# Altium footprint library sun_library.PcbLib: 412 footprints (part 2 of 26)
Each footprint in its own frame and in the unit in brackets; x right, y up, seen from the top. Pads: shape width x height; smd on the part's side, far side on the other; paste and mask are expansions set on the pad; w line width, h text height; cw(c..) or ccw(c..) is an arc to the next point about the centre after c.
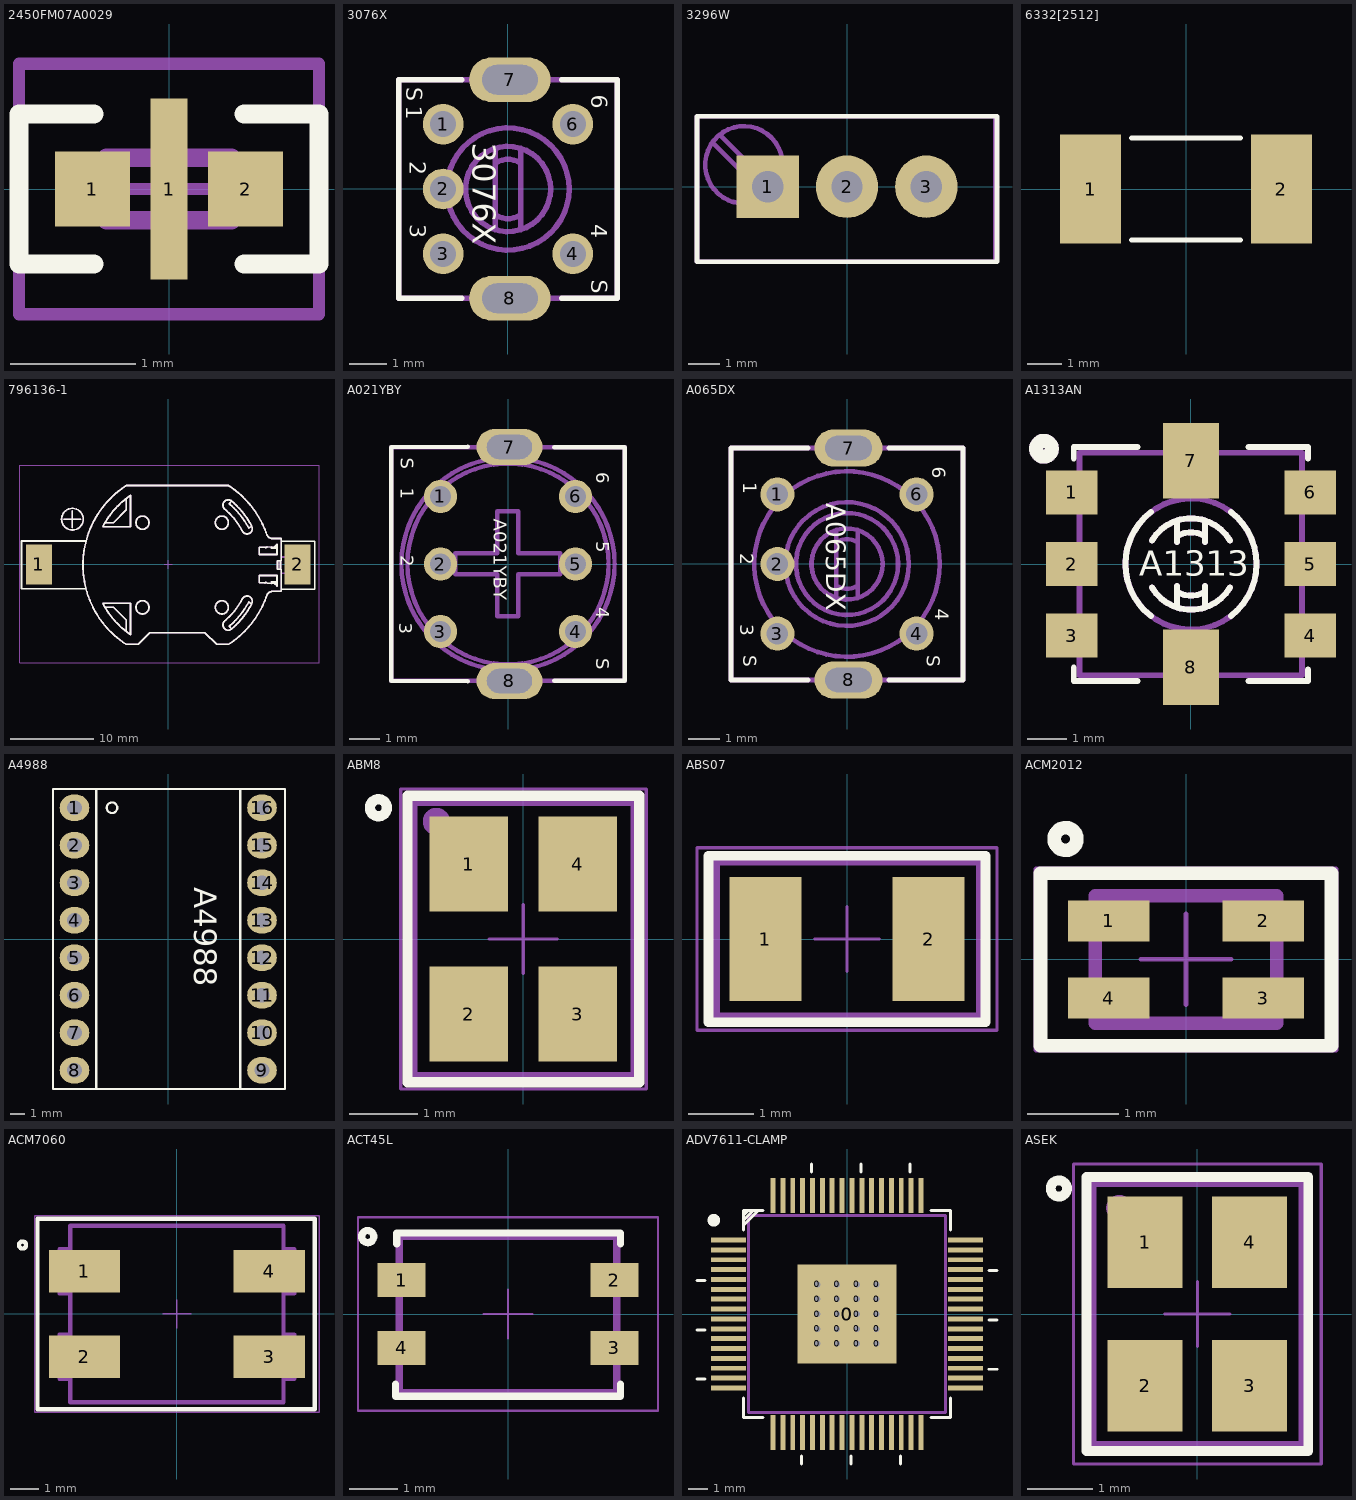
[diagram p1: the footprints below, top view; thin cyan lines are the x and y axes]

## 2450FM07A0029 [mm] "2.45GHz Impedance Matched balun"
height 1.4
pads (3):
  rect 0.6x0.6 smd: 1(-0.613,0) 2(0.613,0)
  rect 0.3x1.45 smd: 1(0,0)
Top Overlay:
  lines w0.15: -0.6,-0.6 -1.2,-0.6 -1.2,0.6 -0.6,0.6 ; 0.6,-0.6 1.2,-0.6 1.2,0.6 0.6,0.6
TopAssy 13:
  lines w0.15: -0.5,-0.25 -0.5,0.25 0.5,0.25 0.5,-0.25 -0.5,-0.25
CourtTop 15:
  lines w0.1: -0.5,0 0.5,0 ; 0,-0.5 0,0.5 ; -1.2,-1 -1.2,1 1.2,1 1.2,-1 -1.2,-1
3D body "User Library-RES0402.step": height 0.35, standoff 0, extent -0.5,-0.25 0.5,0.25

## 3076X [mm]
pads (7):
  round 1.1 hole 0.7: 1(-1.75,1.75) 2(-1.75,0) 3(-1.75,-1.75) 4(1.75,-1.75) 6(1.75,1.75)
  oval 2.2x1.2 hole 0.8 slot 1.5 at 0 deg: 7(0.05,2.95) 8(0.05,-2.95)
Top Overlay:
  lines w0.15: -1.25,-2.95 -2.95,-2.95 -2.95,2.95 -1.25,2.95 ; 1.45,-2.95 2.95,-2.95 2.95,2.95 1.45,2.95
  text "1" at -2.75,2.25 h0.44
  text "2" at -2.65,0.75 h0.44
  text "3" at -2.65,-0.95 h0.44
  text "4" at 2.25,-0.95 h0.44
  text "S" at 2.25,-2.45 h0.44
  text "S" at -2.75,2.75 h0.44
  text "3076X" at -0.95,1.25 h0.63
  text "6" at 2.25,2.55 h0.44
TopAssy 13:
  circle w0.15: c0,0 r1.15
  circle w0.15: c0,0 r1.65
  lines w0.15: -0.35,-1.1 -0.35,1.1 ; -0.35,0.7 cw(c0,0.137) 0.35,0.7 ; -0.349,-0.701 ccw(c0,-0.138) 0.349,-0.701 ; 0.35,-1.1 0.35,1.1 ; -2.95,-2.95 2.95,-2.95 2.95,2.95 -2.95,2.95 -2.95,-2.95

## 3296W [mm] "резистор многооборотный"
height 11.4
pads (3):
  rect 2x2 hole 1: 1(-2.54,0)
  round 2 hole 1: 2(0,0) 3(2.54,0)
Top Overlay:
  lines w0.15: -4.8,-2.4 -4.8,2.25 4.8,2.25 4.8,-2.4 -4.8,-2.4
  text "." at -4.2,2.6 h1.52
TopAssy 13:
  circle w0.15: c-3.3,0.7 r1.237
  lines w0.15: -4.3,1.4 -2.6,-0.3 ; -4.05,1.65 -2.35,-0.05 ; -4.8,-2.4 -4.8,2.25 4.75,2.25 4.75,-2.4 -4.8,-2.4
3D body "User Library-3296W.step": height 11.6, standoff -1.55, extent -4.765,-2.4 4.765,2.4

## 6332[2512] [mm] "Chip Resistor; Body 6.3 x 3.2 mm (LxW typ)"
height 0.6
pads (2):
  rect 1.8x3.2 smd: 1(-2.8,0) 2(2.8,0)
Top Overlay:
  lines w0.15: -1.6,-1.5 1.6,-1.5 ; -1.6,1.5 1.6,1.5

## 796136-1 [mm] "796136-1 BAT_HOLDER"
height 6.3
pads (2):
  rect 3.15x4.78 smd: 1(-15.52,0) 2(15.52,0)
Top Overlay:
  drawing of 1192 lines, arcs and shapes, not listed
TopAssy 13:
  drawing of 1191 lines, arcs and shapes, not listed
CourtTop 15:
  lines w0.05: -0.5,0 0.5,0 ; 0,-0.5 0,0.5 ; -17.8,-11.8 18.1,-11.8 18.1,11.9 -17.8,11.9 -17.8,-11.8
3D body "c-796136-1-h1-3d.stp": height 6.41, standoff -0.11, extent -16.109,-9.625 16.211,9.425

## A021YBY [mm]
pads (8):
  round 1.1 hole 0.7: 1(-2.25,2.25) 2(-2.25,0) 3(-2.25,-2.25) 4(2.25,-2.25) 5(2.25,0) 6(2.25,2.25)
  oval 2.2x1.2 hole 0.8 slot 1.5 at 0 deg: 7(0.05,3.9) 8(0.05,-3.9)
Top Overlay:
  lines w0.15: -1.35,-3.9 -3.9,-3.9 -3.9,3.9 -1.35,3.9 ; 1.55,-3.9 3.9,-3.9 3.9,3.9 1.55,3.9
  text "A021YBY" at -0.473,1.505 h0.44
  text "5" at 2.95,0.75 h0.44
  text "6" at 2.95,3.05 h0.44
  text "S" at 2.95,-3.15 h0.44
  text "S" at -3.573,3.548 h0.44
  text "4" at 2.95,-1.45 h0.44
  text "3" at -3.623,-1.953 h0.44
  text "2" at -3.573,0.298 h0.44
  text "1" at -3.573,2.547 h0.44
TopAssy 13:
  circle w0.15: c0,0 r3.55
  circle w0.15: c0,0 r3.35
  lines w0.15: -3.9,-3.9 -3.9,3.9 3.9,3.9 3.9,-3.9 -3.9,-3.9 ; -1.75,-0.35 -1.75,0.35 -0.35,0.35 -0.35,1.75 0.35,1.75 0.35,0.35 1.75,0.35 1.75,-0.35 0.35,-0.35 0.35,-1.75 -0.35,-1.75 -0.35,-0.35 -1.75,-0.35

## A065DX [mm]
pads (7):
  round 1.1 hole 0.7: 1(-2.25,2.25) 2(-2.25,0) 3(-2.25,-2.25) 4(2.25,-2.25) 6(2.25,2.25)
  oval 2.2x1.2 hole 0.8 slot 1.5 at 0 deg: 7(0.05,3.75) 8(0.05,-3.75)
Top Overlay:
  lines w0.15: -1.25,-3.75 -3.75,-3.75 -3.75,3.75 -1.25,3.75 ; 1.35,-3.75 3.75,-3.75 3.75,3.75 1.35,3.75
  text "6" at 2.75,3.15 h0.44
  text "A065DX" at -0.675,1.972 h0.63
  text "S" at 2.577,-2.953 h0.44
  text "S" at -3.35,-2.95 h0.44
  text "4" at 2.85,-1.45 h0.44
  text "3" at -3.45,-1.95 h0.44
  text "2" at -3.45,0.35 h0.44
  text "1" at -3.35,2.65 h0.44
TopAssy 13:
  circle w0.15: c0,0 r3
  circle w0.15: c0,0 r2
  circle w0.15: c0,0 r1.65
  circle w0.15: c0,0 r1.15
  lines w0.15: -0.35,-1.1 -0.35,1.1 ; -0.35,0.7 cw(c0,0.137) 0.35,0.7 ; -0.349,-0.701 ccw(c0,-0.138) 0.349,-0.701 ; 0.35,-1.1 0.35,1.1 ; -3.75,-3.75 -3.75,3.75 3.75,3.75 3.75,-3.75 -3.75,-3.75

## A1313AN [mm] "Variable Coils for Surface Mounting MURATA"
height 5.7
pads (8):
  rect 1.3x1.1 smd: 1(-3,1.8) 2(-3,0) 3(-3,-1.8) 4(3,-1.8) 5(3,0) 6(3,1.8)
  rect 1.4x1.9 smd: 7(0,2.6) 8(0,-2.6)
Top Overlay:
  circle w0.35: c-3.7,2.9 r0.2
  lines w0.15: -2.95,-2.6 -2.95,-2.95 -1.35,-2.95 ; -2.95,2.65 -2.95,2.95 -1.35,2.95 ; -1.006,-1.308 cw(c0,0) -1.002,1.311 ; -0.986,-0.592 ccw(c0,0) 0.986,-0.592 ; -0.986,0.592 cw(c0,0) 0.986,0.592 ; -0.35,-1.1 -0.35,-0.55 ; -0.35,0.55 -0.35,1.1 ; -0.35,0.7 cw(c0,0.137) 0.35,0.7 ; -0.349,-0.701 ccw(c0,-0.138) 0.349,-0.701 ; 0.35,-1.1 0.35,-0.55 ; 0.35,0.55 0.35,1.1 ; 1.002,-1.311 ccw(c0,0) 1.006,1.308 ; 1.45,-2.95 2.95,-2.95 2.95,-2.65 ; 1.45,2.95 2.95,2.95 2.95,2.65
  text "A1313" at -1.3,-0.3 h0.63
  text "A1313" at -1.3,-0.3 h0.63
TopAssy 13:
  circle w0.15: c0,0 r1.65
  circle w0.35: c-3.7,2.9 r0.2
  lines w0.15: -2.8,-2.15 -3.1,-2.15 -3.1,-1.45 -2.8,-1.45 ; -2.8,-0.35 -3.1,-0.35 -3.1,0.35 -2.8,0.35 ; -2.8,1.45 -3.1,1.45 -3.1,2.15 -2.8,2.15 ; -0.986,-0.592 ccw(c0,0) 0.986,-0.592 ; -0.986,0.592 cw(c0,0) 0.986,0.592 ; -0.35,-2.8 -0.35,-2.225 0.35,-2.225 0.35,-2.8 ; -0.35,-1.1 -0.35,-0.55 ; -0.35,0.55 -0.35,1.1 ; -0.35,0.7 cw(c0,0.137) 0.35,0.7 ; -0.35,2.8 -0.35,2.225 0.35,2.225 0.35,2.8 ; -0.349,-0.701 ccw(c0,-0.138) 0.349,-0.701 ; 0.35,-1.1 0.35,-0.55 ; 0.35,0.55 0.35,1.1 ; 2.8,-2.15 3.1,-2.15 3.1,-1.45 2.8,-1.45 ; 2.8,-0.35 3.1,-0.35 3.1,0.35 2.8,0.35 ; 2.8,1.45 3.1,1.45 3.1,2.15 2.8,2.15 ; -2.8,-2.8 2.8,-2.8 2.8,2.8 -2.8,2.8 -2.8,-2.8
  text "A1313" at -1.3,-0.3 h0.63

## A4988 [mm]
pads (16):
  oval 2x1.8 hole 1: 1(-6.35,8.89) 2(-6.35,6.35) 3(-6.35,3.81) 4(-6.35,1.27) 5(-6.35,-1.27) 6(-6.35,-3.81) 7(-6.35,-6.35) 8(-6.35,-8.89) 9(6.35,-8.89) 10(6.35,-6.35) 11(6.35,-3.81) 12(6.35,-1.27) 13(6.35,1.27) 14(6.35,3.81) 15(6.35,6.35) 16(6.35,8.89)
Top Overlay:
  circle w0.15: c-3.81,8.89 r0.359
  lines w0.15: -4.88,-10.16 -4.88,10.16 ; 4.88,-10.16 4.88,10.16 ; -7.8,-10.16 7.9,-10.16 7.9,10.16 -7.8,10.16 -7.8,-10.16
  text "A4988" at 1.75,3.5 h1.52
3D body "User Library-Mendel 90 - stepstick A4998.step": height 5.62, standoff -5.78, extent -7.6,-10.16 7.642,10.16

## ABM8 [mm] "Quartz Crystal, SM; 4 Leads; Body 3.2 x 2.5 x 1mm (LxWxH)"
height 1
pads (4):
  rect 1.15x1.4 smd: 1(-0.8,1.1) 2(-0.8,-1.1) 3(0.8,-1.1) 4(0.8,1.1)
Top Overlay:
  circle w0.15: c-2.125,1.925 r0.125
  lines w0.15: -1.7,-2.1 1.7,-2.1 1.7,2.1 -1.7,2.1 -1.7,-2.1
TopAssy 13:
  circle w0.15: c-1.275,1.725 r0.125
  lines w0.15: -1.625,-2.025 -1.625,2.025 1.65,2.025 1.65,-2.025 -1.625,-2.025
CourtTop 15:
  lines w0.05: -0.5,0 0.5,0 ; 0,-0.5 0,0.5 ; -1.8,-2.2 1.8,-2.2 1.8,2.2 -1.8,2.2 -1.8,-2.2
3D body "User Library-ABM8.step": height 0.75, standoff -0.01, extent -1.3,-1.6 1.2,1.6

## ABS07 [mm] "Quartz Crystal, SM; 2 Leads; Body 3.2 x 1.5 x 0.9mm (LxWxH)"
height 0.9
pads (2):
  rect 1.1x1.9 smd: 1(-1.25,0) 2(1.25,0)
Top Overlay:
  lines w0.15: -2.125,-1.275 2.125,-1.275 2.125,1.275 -2.125,1.275 -2.125,-1.275
TopAssy 13:
  lines w0.15: -2.025,-1.2 -2.025,1.2 2.05,1.2 2.05,-1.2 -2.025,-1.2
CourtTop 15:
  lines w0.05: -0.5,0 0.5,0 ; 0,-0.5 0,0.5 ; -2.3,-1.4 -2.3,1.4 2.3,1.4 2.3,-1.4 -2.3,-1.4
3D body "User Library-ABS07.STEP": height 0.91, standoff 0, extent -1.61,-0.81 1.61,0.71

## ACM2012 [mm] "ACM2012 2-Line Chip Style  Common Mode Chokes"
height 1.2
pads (4):
  rect 0.9x0.45 smd: 1(-0.85,0.425) 2(0.85,0.425) 3(0.85,-0.425) 4(-0.85,-0.425)
Top Overlay:
  circle w0.15: c-1.325,1.325 r0.125
  lines w0.15: -1.6,-0.95 -1.6,0.95 1.6,0.95 1.6,-0.95 -1.6,-0.95
TopAssy 13:
  lines w0.15: -1,-0.7 1,-0.7 1,0.7 -1,0.7 -1,-0.7
CourtTop 15:
  lines w0.05: -0.5,0 0.5,0 ; 0,-0.5 0,0.5 ; -1.65,-1 1.65,-1 1.65,1 -1.65,1 -1.65,-1
3D body "Coilcraft-0805USB.step": height 1.64, standoff -0.01, extent -1.01,-0.645 1.01,0.645

## ACM7060 [mm] "Common Mode Filters"
height 3.5
pads (4):
  rect 2.5x1.5 smd mask+0.07: 1(-3.25,1.5) 2(-3.25,-1.5) 3(3.25,-1.5) 4(3.25,1.5)
Top Overlay:
  circle w0.15: c-5.425,2.425 r0.125
  lines w0.15: -4.9,-3.35 4.85,-3.35 4.85,3.35 -4.9,3.35 -4.9,-3.35
TopAssy 13:
  lines w0.15: -3.75,-2.275 -4.125,-2.275 -4.125,-0.725 -3.75,-0.725 ; -3.75,0.725 -4.125,0.725 -4.125,2.275 -3.75,2.275 ; 3.75,-2.275 4.125,-2.275 4.125,-0.725 3.75,-0.725 ; 3.75,0.725 4.125,0.725 4.125,2.275 3.75,2.275 ; -3.75,-3.1 -3.75,3.1 ; -3.75,-3.1 3.75,-3.1 ; -3.75,-3.1 3.75,-3.1 ; -3.75,-3.1 -3.75,3.1 ; -3.75,3.1 3.75,3.1 ; -3.75,3.1 3.75,3.1 ; 3.75,-3.1 3.75,3.1 ; 3.75,-3.1 3.75,3.1
CourtTop 15:
  lines w0.05: -0.5,0 0.5,0 ; 0,-0.5 0,0.5 ; -5,-3.45 5,-3.45 5,3.45 -5,3.45 -5,-3.45
3D body "ACM7060.STEP": height 3.51, standoff 0.01, extent -3.5,-3 3.5,3

## ACT45L [mm] "ACT45L 2-Line Chip Style  Common Mode Chokes"
height 1.2
pads (4):
  rect 1x0.7 smd: 1(-2.2,0.7) 2(2.2,0.7) 3(2.2,-0.7) 4(-2.2,-0.7)
Top Overlay:
  circle w0.15: c-2.9,1.6 r0.125
  lines w0.15: -2.325,-1.45 -2.325,-1.7 2.325,-1.7 2.325,-1.45 ; -2.3,1.45 -2.3,1.675 2.325,1.675 2.325,1.45
TopAssy 13:
  lines w0.15: -2.25,-1.625 -2.25,1.6 2.25,1.6 2.25,-1.625 -2.25,-1.625
CourtTop 15:
  lines w0.05: -0.5,0 0.5,0 ; 0,-0.5 0,0.5 ; -3.1,-2 -3.1,2 3.1,2 3.1,-2 -3.1,-2
3D body "User Library-ACT45B_GERMANY.step": height 3, standoff 0, extent -2.25,-1.6 2.25,1.6

## ADV7611-CLAMP [mm]
pads (86):
  round 0.6 hole 0.3 mask+0: 0(-1.5,-1.5) 0(-1.5,-0.75) 0(-1.5,0) 0(-1.5,0.75) 0(-1.5,1.5) 0(-0.5,-1.5) 0(-0.5,-0.75) 0(-0.5,0) 0(-0.5,0.75) 0(-0.5,1.5) 0(0.5,-1.5) 0(0.5,-0.75) 0(0.5,0) 0(0.5,0.75) 0(0.5,1.5) 0(1.5,-1.5) 0(1.5,-0.75) 0(1.5,0) 0(1.5,0.75) 0(1.5,1.5)
  rect 5x5 smd: 0(0,0)
  rect 3.5x3.5 smd far side: 0(0,0)
  rect 1.78x0.25 smd mask+0.075: 1(-6,3.75) 2(-6,3.25) 3(-6,2.75) 4(-6,2.25) 5(-6,1.75) 6(-6,1.25) 7(-6,0.75) 8(-6,0.25) 9(-6,-0.25) 10(-6,-0.75) 11(-6,-1.25) 12(-6,-1.75) 13(-6,-2.25) 14(-6,-2.75) 15(-6,-3.25) 16(-6,-3.75) 33(6,-3.75) 34(6,-3.25) 35(6,-2.75) 36(6,-2.25) 37(6,-1.75) 38(6,-1.25) 39(6,-0.75) 40(6,-0.25) 41(6,0.25) 42(6,0.75) 43(6,1.25) 44(6,1.75) 45(6,2.25) 46(6,2.75) 47(6,3.25) 48(6,3.75)
  rect 0.25x1.78 smd mask+0.075: 17(-3.75,-6) 18(-3.25,-6) 19(-2.75,-6) 20(-2.25,-6) 21(-1.75,-6) 22(-1.25,-6) 23(-0.75,-6) 24(-0.25,-6) 25(0.25,-6) 26(0.75,-6) 27(1.25,-6) 28(1.75,-6) 29(2.25,-6) 30(2.75,-6) 31(3.25,-6) 32(3.75,-6) 49(3.75,6) 50(3.25,6) 51(2.75,6) 52(2.25,6) 53(1.75,6) 54(1.25,6) 55(0.75,6) 56(0.25,6) 57(-0.25,6) 58(-0.75,6) 59(-1.25,6) 60(-1.75,6) 61(-2.25,6) 62(-2.75,6) 63(-3.25,6) 64(-3.75,6)
Top Overlay:
  circle w0.15: c-6.75,4.75 r0.25
  lines w0.15: -7.6,-3.3 -7.2,-3.3 ; -7.6,-0.8 -7.2,-0.8 ; -7.6,1.7 -7.2,1.7 ; -6.95,4.75 -6.725,4.975 ; -6.9,4.6 -6.6,4.9 ; -6.75,4.55 -6.525,4.775 ; -5.25,-4.25 -5.25,-5.25 -4.25,-5.25 ; -5.25,4.25 -5.25,5.25 -4.25,5.25 ; -5.25,4.5 -4.5,5.25 ; -5.25,4.75 -4.75,5.25 ; -5.25,5 -5,5.25 ; -2.3,-7.6 -2.3,-7.2 ; -1.8,7.2 -1.8,7.6 ; 0.2,-7.6 0.2,-7.2 ; 0.7,7.2 0.7,7.6 ; 2.7,-7.6 2.7,-7.2 ; 3.2,7.2 3.2,7.6 ; 4.25,-5.25 5.25,-5.25 5.25,-4.25 ; 4.25,5.25 5.25,5.25 5.25,4.25 ; 7.2,-2.8 7.6,-2.8 ; 7.2,-0.3 7.6,-0.3 ; 7.2,2.2 7.6,2.2
TopAssy 13:
  lines w0.15: -5,-5 -5,5 5,5 5,-5 -5,-5
3D body "SW3dPS-S-PQFP-G64.STEP": height 1, standoff 0, extent -5.8,-5.787 5.781,5.787

## ASEK [mm] "ASEK-2-32.768KHZ-L-R-T"
height 1.2
pads (4):
  rect 1.15x1.4 smd: 1(-0.8,1.1) 2(-0.8,-1.1) 3(0.8,-1.1) 4(0.8,1.1)
Top Overlay:
  circle w0.15: c-2.125,1.925 r0.125
  lines w0.15: -1.7,-2.1 1.7,-2.1 1.7,2.1 -1.7,2.1 -1.7,-2.1
TopAssy 13:
  circle w0.15: c-1.2,1.625 r0.125
  lines w0.15: -1.625,-2.025 -1.625,2.025 1.625,2.025 1.625,-2.025 -1.625,-2.025
CourtTop 15:
  lines w0.05: -0.5,0 0.5,0 ; 0,-0.5 0,0.5 ; -1.9,-2.3 1.9,-2.3 1.9,2.3 -1.9,2.3 -1.9,-2.3
3D body "ASEK.STEP": height 1.2, standoff 0, extent -1.3,-1.6 1.2,1.6